# Altium footprint library ICPOWER.PcbLib: 71 footprints (part 5 of 5)
Each footprint in its own frame and in the unit in brackets; x right, y up, seen from the top. Pads: shape width x height; smd on the part's side, far side on the other; paste and mask are expansions set on the pad; w line width, h text height; cw(c..) or ccw(c..) is an arc to the next point about the centre after c.
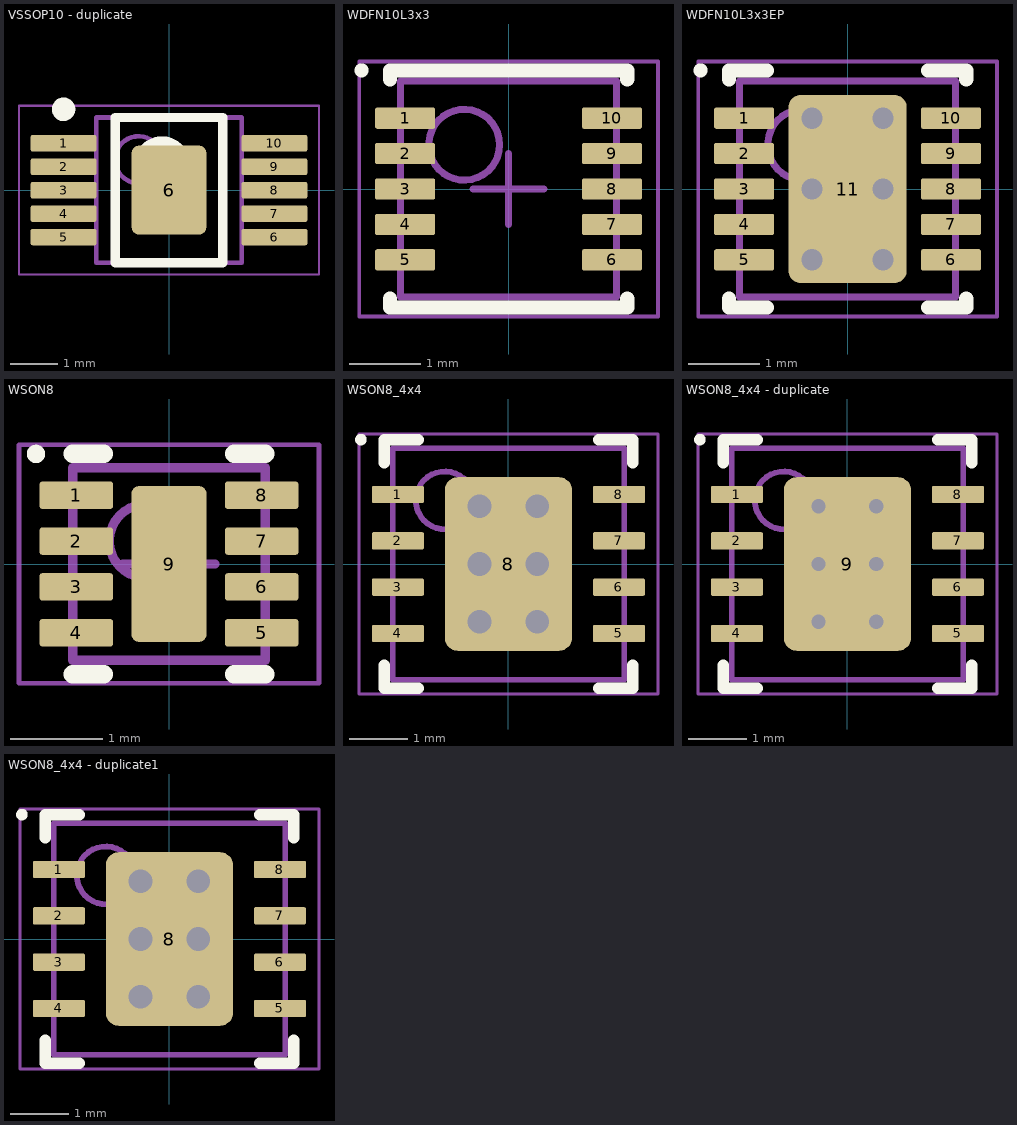
[diagram p4: the footprints below, top view; thin cyan lines are the x and y axes]

## VSSOP10 - duplicate [mm] "TPS40210DGQR  _VSSOP10, IPC Medium Density"
height 1.1
pads (11):
  rrect20% 1.4x0.35 smd mask+0.05: 1(-2.25,1) 2(-2.25,0.5) 3(-2.25,0) 4(-2.25,-0.5) 5(-2.25,-1) 6(2.25,-1) 7(2.25,-0.5) 8(2.25,0) 9(2.25,0.5) 10(2.25,1)
  rrect20% 1.6x1.9 smd mask+0.05: 6(0,0)
Top Overlay:
  circle w0.6: c-0.15,0.55 r0.3
  circle w0.25: c-2.25,1.725 r0.125
  lines w0.2: -1.15,-1.55 1.15,-1.55 1.15,1.55 -1.15,1.55 -1.15,-1.55
Mechanical 13:
  circle w0.1: c-0.65,0.65 r0.5
  lines w0.1: -1.55,-1.55 1.55,-1.55 1.55,1.55 -1.55,1.55 -1.55,-1.55
Mechanical 15:
  lines w0.05: -3.2,-1.8 3.2,-1.8 3.2,1.8 -3.2,1.8 -3.2,-1.8
  lines w0.1: -0.5,0 0.5,0 ; 0,-0.5 0,0.5
3D body "VSSOP10_.step": height 1.1, standoff 0, extent -2.525,-1.55 2.525,1.55

## WDFN10L3x3 [mm] "SON, 10-Leads, Body 3.05x3.05mm, Pitch 0.50mm, IPC Medium Density"
height 0.8
pads (10):
  rrect20% 0.85x0.3 smd: 1(-1.46,1) 2(-1.46,0.5) 3(-1.46,0) 4(-1.46,-0.5) 5(-1.46,-1) 6(1.46,-1) 7(1.46,-0.5) 8(1.46,0) 9(1.46,0.5) 10(1.46,1)
Top Overlay:
  circle w0.1: c-2.075,1.675 r0.05
  lines w0.2: -1.675,-1.55 -1.675,-1.675 1.675,-1.675 1.675,-1.55 ; -1.675,1.55 -1.675,1.675 1.675,1.675 1.675,1.55
Mechanical 13:
  circle w0.1: c-0.625,0.625 r0.5
  lines w0.1: -1.525,-1.525 -1.525,1.525 1.525,1.525 1.525,-1.525 -1.525,-1.525
Mechanical 15:
  lines w0.05: -2.11,-1.8 -2.11,1.8 2.11,1.8 2.11,-1.8 -2.11,-1.8
  lines w0.1: -0.5,0 0.5,0 ; 0,-0.5 0,0.5
3D body "WDFN10L3x3.step": height 0.8, standoff 0, extent -1.625,-1.525 1.625,1.525

## WDFN10L3x3EP [mm] "SON, 10-Leads, Body 3.05x3.05mm, Pitch 0.50mm, Thermal Pad 2.65x1.67mm, IPC Medium Density"
height 0.8
pads (11):
  rrect20% 0.85x0.3 smd: 1(-1.46,1) 2(-1.46,0.5) 3(-1.46,0) 4(-1.46,-0.5) 5(-1.46,-1) 6(1.46,-1) 7(1.46,-0.5) 8(1.46,0) 9(1.46,0.5) 10(1.46,1)
  rrect20% 1.67x2.65 smd: 11(0,0)
via 0.5,-1 diameter 0.6 hole 0.3
via -0.5,-1 diameter 0.6 hole 0.3
via 0.5,0 diameter 0.6 hole 0.3
via -0.5,0 diameter 0.6 hole 0.3
via 0.5,1 diameter 0.6 hole 0.3
via -0.5,1 diameter 0.6 hole 0.3
Top Overlay:
  circle w0.1: c-2.075,1.675 r0.05
  lines w0.2: -1.675,-1.55 -1.675,-1.675 -1.135,-1.675 ; -1.675,1.55 -1.675,1.675 -1.135,1.675 ; 1.135,-1.675 1.675,-1.675 1.675,-1.55 ; 1.135,1.675 1.675,1.675 1.675,1.55
Mechanical 13:
  circle w0.1: c-0.625,0.625 r0.5
  lines w0.1: -1.525,-1.525 1.525,-1.525 1.525,1.525 -1.525,1.525 -1.525,-1.525
Mechanical 15:
  lines w0.05: -2.11,-1.8 2.11,-1.8 2.11,1.8 -2.11,1.8 -2.11,-1.8
  lines w0.1: -0.5,0 0.5,0 ; 0,-0.5 0,0.5
3D body "WDFN10L3x3EP.step": height 0.8, standoff 0, extent -1.625,-1.525 1.625,1.525

## WSON8 [mm] "2x2mm TPS22975, SON, 8-Leads, Body 2,10x2,10mm, Pitch 0,50mm, Thermal Pad 1,70x0,82mm, IPC Medium Density"
height 0.8
pads (9):
  rrect20% 0.8x0.3 smd: 1(-1.01,0.75) 2(-1.01,0.25) 3(-1.01,-0.25) 4(-1.01,-0.75) 5(1.01,-0.75) 6(1.01,-0.25) 7(1.01,0.25) 8(1.01,0.75)
  rrect20% 0.82x1.7 smd: 9(0,0)
Top Overlay:
  circle w0.1: c-1.45,1.2 r0.05
  lines w0.2: -1.05,-1.2 -0.71,-1.2 ; -1.05,1.2 -0.71,1.2 ; 0.71,-1.2 1.05,-1.2 ; 0.71,1.2 1.05,1.2
Mechanical 13:
  circle w0.1: c-0.25,0.25 r0.4
  lines w0.1: -1.05,-1.05 -1.05,1.05 1.05,1.05 1.05,-1.05 -1.05,-1.05
Mechanical 15:
  lines w0.05: -1.635,-1.3 -1.635,1.3 1.635,1.3 1.635,-1.3 -1.635,-1.3
  lines w0.1: -0.5,0 0.5,0 ; 0,-0.5 0,0.5
3D body "WSON8.step": height 0.8, standoff 0, extent -1.051,-1.05 1.051,1.05

## WSON8_4x4 [mm] "TI LM1086ILD"
height 0.8
pads (9):
  rrect20% 0.9x0.3 smd: 1(-1.91,1.2) 2(-1.91,0.4) 3(-1.91,-0.4) 4(-1.91,-1.2) 5(1.91,-1.2) 6(1.91,-0.4) 7(1.91,0.4) 8(1.91,1.2)
  rrect20% 2.2x3 smd paste-1.1: 8(0,0)
via -0.5,1 diameter 0.914 hole 0.406
via 0.5,1 diameter 0.914 hole 0.406
via -0.5,0 diameter 0.914 hole 0.406
via 0.5,0 diameter 0.914 hole 0.406
via -0.5,-1 diameter 0.914 hole 0.406
via 0.5,-1 diameter 0.914 hole 0.406
Top Overlay:
  circle w0.1: c-2.55,2.15 r0.05
  lines w0.2: -2.15,-1.75 -2.15,-2.15 -1.56,-2.15 ; -2.15,1.75 -2.15,2.15 -1.56,2.15 ; 1.56,-2.15 2.15,-2.15 2.15,-1.75 ; 1.56,2.15 2.15,2.15 2.15,1.75
Top Paste:
  rectangle: -1,0.1 -0.1,1.4
  rectangle: -1,-1.4 -0.1,-0.1
  rectangle: 0.1,0.1 1,1.4
  rectangle: 0.1,-1.4 1,-0.1
Mechanical 13:
  circle w0.1: c-1.1,1.1 r0.5
  lines w0.1: -2,-2 -2,2 2,2 2,-2 -2,-2
Mechanical 15:
  lines w0.05: -2.585,-2.25 -2.585,2.25 2.585,2.25 2.585,-2.25 -2.585,-2.25
  lines w0.1: -0.5,0 0.5,0 ; 0,-0.5 0,0.5
3D body "WSON8_4x4.step": height 0.8, standoff 0, extent -2.001,-2 2.001,2

## WSON8_4x4 - duplicate [mm] "TI LM1086ILD"
height 0.8
pads (9):
  rrect20% 0.9x0.3 smd: 1(-1.91,1.2) 2(-1.91,0.4) 3(-1.91,-0.4) 4(-1.91,-1.2) 5(1.91,-1.2) 6(1.91,-0.4) 7(1.91,0.4) 8(1.91,1.2)
  rrect20% 2.2x3 smd paste-1.1: 9(0,0)
via 0.5,-1 diameter 0.55 hole 0.25
via -0.5,-1 diameter 0.55 hole 0.25
via 0.5,0 diameter 0.55 hole 0.25
via -0.5,0 diameter 0.55 hole 0.25
via 0.5,1 diameter 0.55 hole 0.25
via -0.5,1 diameter 0.55 hole 0.25
Top Overlay:
  circle w0.1: c-2.55,2.15 r0.05
  lines w0.2: -2.15,-1.75 -2.15,-2.15 -1.56,-2.15 ; -2.15,1.75 -2.15,2.15 -1.56,2.15 ; 1.56,-2.15 2.15,-2.15 2.15,-1.75 ; 1.56,2.15 2.15,2.15 2.15,1.75
Top Paste:
  rectangle: 0.1,-1.4 1,-0.1
  rectangle: 0.1,0.1 1,1.4
  rectangle: -1,-1.4 -0.1,-0.1
  rectangle: -1,0.1 -0.1,1.4
Mechanical 13:
  circle w0.1: c-1.1,1.1 r0.5
  lines w0.1: -2,-2 2,-2 2,2 -2,2 -2,-2
Mechanical 15:
  lines w0.05: -2.585,-2.25 2.585,-2.25 2.585,2.25 -2.585,2.25 -2.585,-2.25
  lines w0.1: -0.5,0 0.5,0 ; 0,-0.5 0,0.5
3D body "WSON8_4x4.step": height 0.8, standoff 0, extent -2.001,-2 2.001,2

## WSON8_4x4 - duplicate1 [mm] "TI LM1086ILD"
height 0.8
pads (9):
  rrect20% 0.9x0.3 smd: 1(-1.91,1.2) 2(-1.91,0.4) 3(-1.91,-0.4) 4(-1.91,-1.2) 5(1.91,-1.2) 6(1.91,-0.4) 7(1.91,0.4) 8(1.91,1.2)
  rrect20% 2.2x3 smd paste-1.1: 8(0,0)
via 0.5,-1 diameter 0.914 hole 0.406
via -0.5,-1 diameter 0.914 hole 0.406
via 0.5,0 diameter 0.914 hole 0.406
via -0.5,0 diameter 0.914 hole 0.406
via 0.5,1 diameter 0.914 hole 0.406
via -0.5,1 diameter 0.914 hole 0.406
Top Overlay:
  circle w0.1: c-2.55,2.15 r0.05
  lines w0.2: -2.15,-1.75 -2.15,-2.15 -1.56,-2.15 ; -2.15,1.75 -2.15,2.15 -1.56,2.15 ; 1.56,-2.15 2.15,-2.15 2.15,-1.75 ; 1.56,2.15 2.15,2.15 2.15,1.75
Top Paste:
  rectangle: 0.1,-1.4 1,-0.1
  rectangle: 0.1,0.1 1,1.4
  rectangle: -1,-1.4 -0.1,-0.1
  rectangle: -1,0.1 -0.1,1.4
Mechanical 13:
  circle w0.1: c-1.1,1.1 r0.5
  lines w0.1: -2,-2 2,-2 2,2 -2,2 -2,-2
Mechanical 15:
  lines w0.05: -2.585,-2.25 2.585,-2.25 2.585,2.25 -2.585,2.25 -2.585,-2.25
  lines w0.1: -0.5,0 0.5,0 ; 0,-0.5 0,0.5
3D body "WSON8_4x4.step": height 0.8, standoff 0, extent -2.001,-2 2.001,2